# Altium footprint library ICs And Semiconductors THD.PcbLib: 350 footprints (part 12 of 22)
Each footprint in its own frame and in the unit in brackets; x right, y up, seen from the top. Pads: shape width x height; smd on the part's side, far side on the other; paste and mask are expansions set on the pad; w line width, h text height; cw(c..) or ccw(c..) is an arc to the next point about the centre after c.
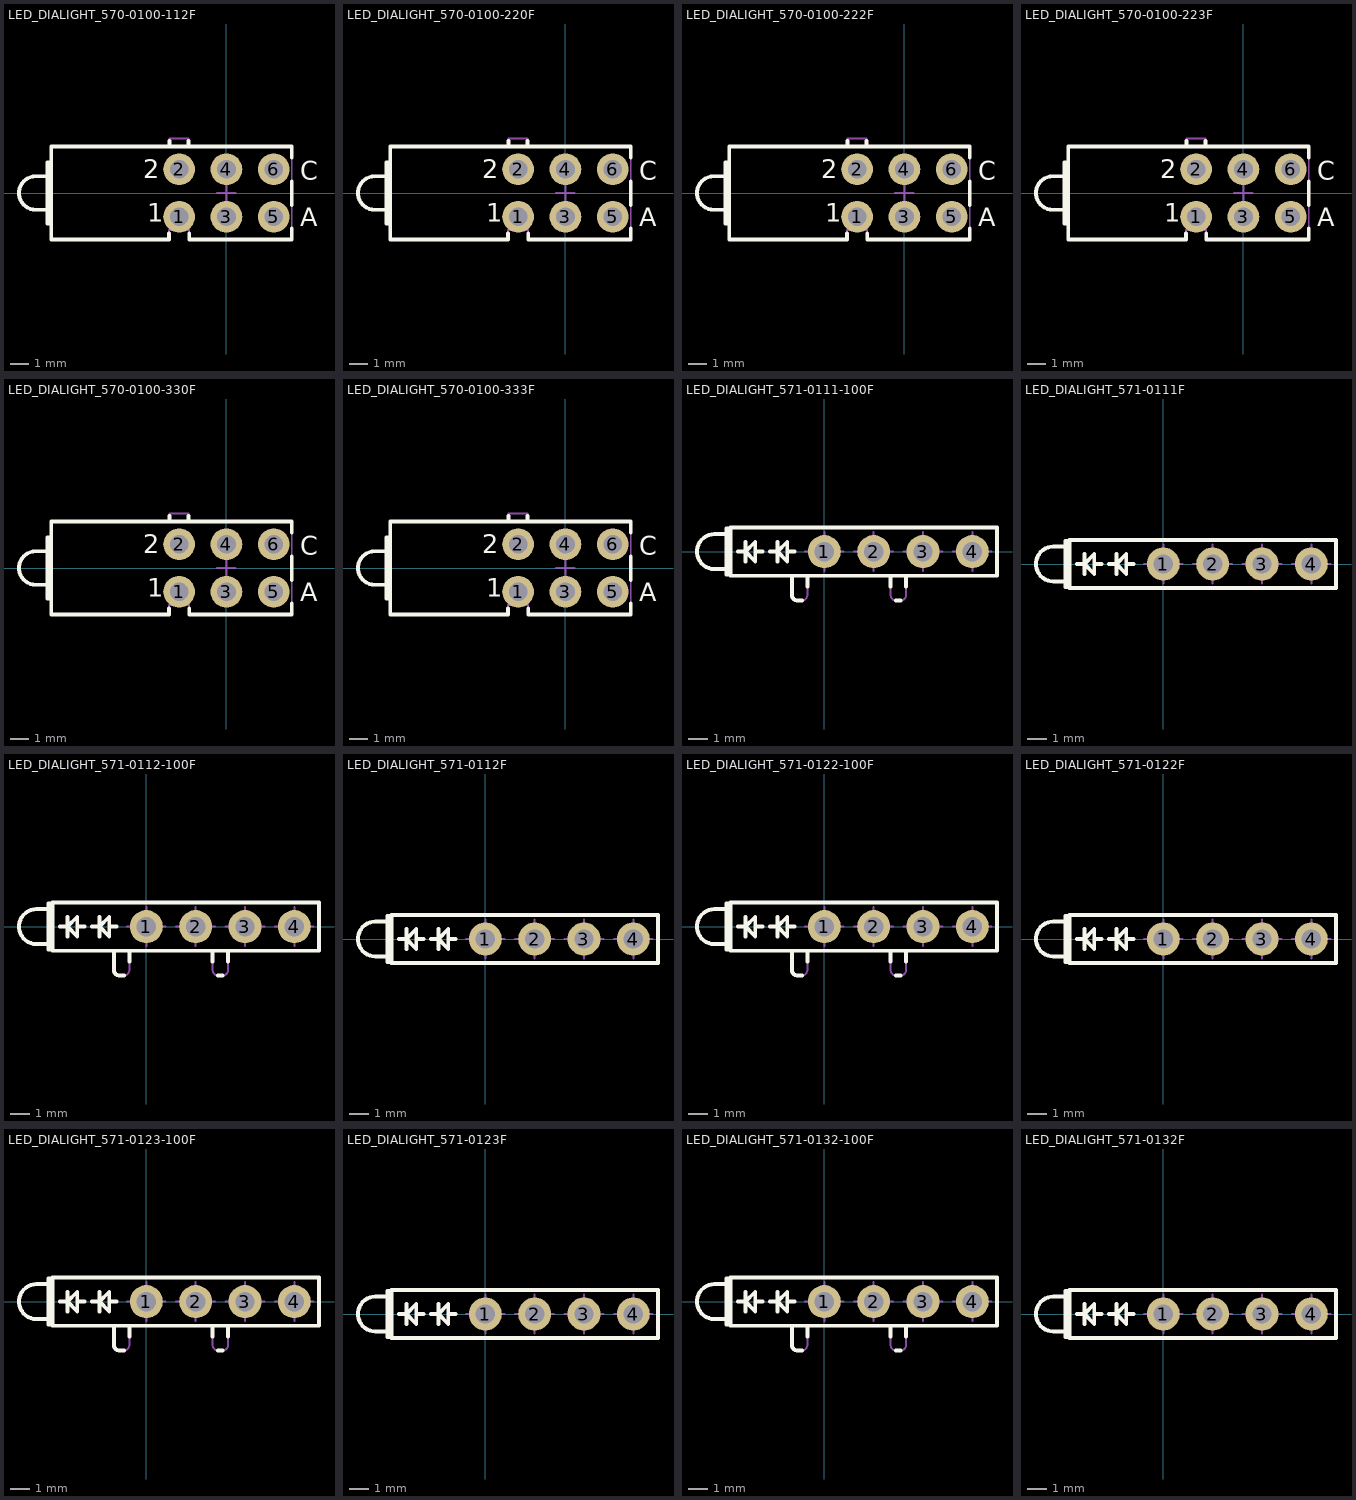
[diagram p11: the footprints below, top view; thin cyan lines are the x and y axes]

## LED_DIALIGHT_570-0100-112F [mm] "3x 2mm LED (Top: Red , Middle: Red, Bot: Green) PCB Edge Mounting DIALIGHT 570 Serie"
height 10.41
pads (6):
  round 1.7 hole 1: 1(-2.54,-1.27) 2(-2.54,1.27) 3(0,-1.27) 4(0,1.27) 5(2.54,-1.27) 6(2.54,1.27)
Top Overlay:
  lines w0.2: -9.59,-0.9 -10.22,-0.9 cw(c-10.22,0) -10.22,0.9 -9.59,0.9 ; -9.39,-1.651 -9.59,-1.651 -9.59,1.651 -9.39,1.651 ; -9.39,2.485 -9.39,-2.485 -3.086,-2.485 -3.086,-2.167 ; -3.086,2.493 -9.39,2.493 3.5,2.493 ; -3.048,2.493 -3.048,2.789 ; -2.032,2.493 -2.032,2.789 ; -1.994,-2.167 -1.994,-2.485 3.5,-2.485 3.5,-1.903 ; -1.994,2.493 3.5,2.493 ; 3.5,-0.637 3.5,0.637 ; 3.5,1.903 3.5,2.493
  text "2" at -4.458,0.79 h1
  text "1" at -4.243,-1.53 h1
  text "C" at 3.96,0.705 h1
  text "A" at 3.96,-1.79 h1
Notvisible:
  lines w0.1: -3.04,-1.27 -2.54,-1.27 ; -3.04,-1.27 -2.54,-1.27 ; -3.04,-1.27 -2.54,-1.27 ; -3.04,1.27 -2.54,1.27 ; -3.04,1.27 -2.54,1.27 ; -3.04,1.27 -2.54,1.27 ; -2.54,-1.77 -2.54,-1.27 ; -2.54,-1.77 -2.54,-1.27 ; -2.54,-1.77 -2.54,-1.27 ; -2.54,-1.27 -2.04,-1.27 ; -2.54,-1.27 -2.54,-0.77 ; -2.54,-1.27 -2.04,-1.27 ; -2.54,-1.27 -2.54,-0.77 ; -2.54,-1.27 -2.04,-1.27 ; -2.54,-1.27 -2.54,-0.77 ; -2.54,0.77 -2.54,1.27 ; -2.54,0.77 -2.54,1.27 ; -2.54,0.77 -2.54,1.27 ; -2.54,1.27 -2.04,1.27 ; -2.54,1.27 -2.54,1.77 ; -2.54,1.27 -2.04,1.27 ; -2.54,1.27 -2.54,1.77 ; -2.54,1.27 -2.04,1.27 ; -2.54,1.27 -2.54,1.77 ; -0.5,-1.27 0,-1.27 ; -0.5,-1.27 0,-1.27 ; -0.5,-1.27 0,-1.27 ; -0.5,0 0,0 ; -0.5,0 0,0 ; -0.5,0 0,0 ; -0.5,1.27 0,1.27 ; -0.5,1.27 0,1.27 ; -0.5,1.27 0,1.27 ; 0,-1.77 0,-1.27 ; 0,-1.77 0,-1.27 ; 0,-1.77 0,-1.27 ; 0,-1.27 0.5,-1.27 ; 0,-1.27 0,-0.77 ; 0,-1.27 0.5,-1.27 ; 0,-1.27 0,-0.77 ; 0,-1.27 0.5,-1.27 ; 0,-1.27 0,-0.77 ; 0,-0.5 0,0 ; 0,-0.5 0,0 ; 0,-0.5 0,0 ; 0,0 0.5,0 ; 0,0 0,0.5 ; 0,0 0.5,0 ; 0,0 0,0.5 ; 0,0 0.5,0 ; 0,0 0,0.5 ; 0,0.77 0,1.27 ; 0,0.77 0,1.27 ; 0,0.77 0,1.27 ; 0,1.27 0.5,1.27 ; 0,1.27 0,1.77 ; 0,1.27 0.5,1.27 ; 0,1.27 0,1.77 ; 0,1.27 0.5,1.27 ; 0,1.27 0,1.77 ; 2.04,-1.27 2.54,-1.27 ; 2.04,-1.27 2.54,-1.27 ; 2.04,-1.27 2.54,-1.27 ; 2.04,1.27 2.54,1.27 ; 2.04,1.27 2.54,1.27 ; 2.04,1.27 2.54,1.27 ; 2.54,-1.77 2.54,-1.27 ; 2.54,-1.77 2.54,-1.27 ; 2.54,-1.77 2.54,-1.27 ; 2.54,-1.27 3.04,-1.27 ; 2.54,-1.27 2.54,-0.77 ; 2.54,-1.27 3.04,-1.27 ; 2.54,-1.27 2.54,-0.77 ; 2.54,-1.27 3.04,-1.27 ; 2.54,-1.27 2.54,-0.77 ; 2.54,0.77 2.54,1.27 ; 2.54,0.77 2.54,1.27 ; 2.54,0.77 2.54,1.27 ; 2.54,1.27 3.04,1.27 ; 2.54,1.27 2.54,1.77 ; 2.54,1.27 3.04,1.27 ; 2.54,1.27 2.54,1.77 ; 2.54,1.27 3.04,1.27 ; 2.54,1.27 2.54,1.77
Mechanical 14:
  lines w0.1: -3.048,2.485 -3.048,2.917 ; -2.032,2.485 -2.032,2.917 ; -10.22,-0.9 cw(c-10.22,0) -10.22,0.9 ; -10.22,-0.9 cw(c-10.22,0) -10.22,0.9 ; -10.22,-0.9 cw(c-10.22,0) -10.22,0.9 ; -10.22,-0.9 -9.59,-0.9 ; -10.22,-0.9 -9.59,-0.9 ; -10.22,-0.9 -9.59,-0.9 ; -10.22,0.9 -9.59,0.9 ; -10.22,0.9 -9.59,0.9 ; -10.22,0.9 -9.59,0.9 ; -9.59,-1.651 -9.39,-1.651 ; -9.59,-1.651 -9.59,1.651 ; -9.59,-1.651 -9.39,-1.651 ; -9.59,-1.651 -9.59,1.651 ; -9.59,-1.651 -9.39,-1.651 ; -9.59,-1.651 -9.59,1.651 ; -9.59,1.651 -9.39,1.651 ; -9.59,1.651 -9.39,1.651 ; -9.59,1.651 -9.39,1.651 ; -9.39,-2.485 -3.086,-2.485 ; -9.39,-2.485 -9.39,2.485 ; -9.39,-2.485 -3.086,-2.485 ; -9.39,-2.485 -9.39,2.485 ; -9.39,-2.485 -3.086,-2.485 ; -9.39,-2.485 -9.39,2.485 ; -9.39,2.493 3.5,2.493 ; -9.39,2.493 -3.048,2.493 ; -9.39,2.493 -3.048,2.493 ; -3.086,-2.485 -3.086,-1.977 ; -3.086,-2.485 -3.086,-1.977 ; -3.086,-2.485 -3.086,-1.977 ; -3.086,-1.977 -1.994,-1.977 ; -3.086,-1.977 -1.994,-1.977 ; -3.086,-1.977 -1.994,-1.977 ; -3.048,2.493 -3.048,2.917 ; -3.048,2.493 -3.048,2.917 ; -3.048,2.917 -2.032,2.917 ; -3.048,2.917 -2.032,2.917 ; -3.048,2.917 -2.032,2.917 ; -2.032,2.493 -2.032,2.917 ; -2.032,2.493 3.5,2.493 ; -2.032,2.493 -2.032,2.917 ; -1.994,-2.485 3.5,-2.485 ; -1.994,-2.485 -1.994,-1.977 ; -1.994,-2.485 3.5,-2.485 ; -1.994,-2.485 -1.994,-1.977 ; -1.994,-2.485 3.5,-2.485 ; -1.994,-2.485 -1.994,-1.977 ; 3.5,-2.485 3.5,2.493 ; 3.5,-2.485 3.5,2.493 ; 3.5,-2.485 3.5,2.493
  text "2" at -4.458,0.79 h1
  text "1" at -4.243,-1.53 h1
  text "C" at 3.96,0.705 h1
  text "A" at 3.96,-1.79 h1
3D body "LED_DIALIGHT_570-0100-112F.stp": height 10.41, standoff -3.2, extent -11.12,-2.485 3.5,2.917

## LED_DIALIGHT_570-0100-220F [mm] "3x 2mm LED (Top: Green , Middle: Green, Bot: Blank) PCB Edge Mounting DIALIGHT 570 Serie"
height 10.41
pads (6):
  round 1.7 hole 1: 1(-2.54,-1.27) 2(-2.54,1.27) 3(0,-1.27) 4(0,1.27) 5(2.54,-1.27) 6(2.54,1.27)
Top Overlay:
  lines w0.2: -9.59,-0.9 -10.22,-0.9 cw(c-10.22,0) -10.22,0.9 -9.59,0.9 ; -9.39,-1.651 -9.59,-1.651 -9.59,1.651 -9.39,1.651 ; -9.39,2.485 -9.39,-2.485 -3.086,-2.485 -3.086,-2.167 ; -3.086,2.493 -9.39,2.493 3.5,2.493 ; -3.048,2.493 -3.048,2.789 ; -2.032,2.493 -2.032,2.789 ; -1.994,-2.167 -1.994,-2.485 3.5,-2.485 3.5,-1.903 ; -1.994,2.493 3.5,2.493 ; 3.5,-0.637 3.5,0.637 ; 3.5,1.903 3.5,2.493
  text "A" at 3.96,-1.79 h1
  text "C" at 3.96,0.705 h1
  text "1" at -4.243,-1.53 h1
  text "2" at -4.458,0.79 h1
Notvisible:
  lines w0.1: -3.04,-1.27 -2.54,-1.27 ; -3.04,-1.27 -2.54,-1.27 ; -3.04,-1.27 -2.54,-1.27 ; -3.04,1.27 -2.54,1.27 ; -3.04,1.27 -2.54,1.27 ; -3.04,1.27 -2.54,1.27 ; -2.54,-1.77 -2.54,-1.27 ; -2.54,-1.77 -2.54,-1.27 ; -2.54,-1.77 -2.54,-1.27 ; -2.54,-1.27 -2.54,-0.77 ; -2.54,-1.27 -2.04,-1.27 ; -2.54,-1.27 -2.54,-0.77 ; -2.54,-1.27 -2.04,-1.27 ; -2.54,-1.27 -2.04,-1.27 ; -2.54,-1.27 -2.54,-0.77 ; -2.54,0.77 -2.54,1.27 ; -2.54,0.77 -2.54,1.27 ; -2.54,0.77 -2.54,1.27 ; -2.54,1.27 -2.54,1.77 ; -2.54,1.27 -2.04,1.27 ; -2.54,1.27 -2.54,1.77 ; -2.54,1.27 -2.04,1.27 ; -2.54,1.27 -2.04,1.27 ; -2.54,1.27 -2.54,1.77 ; -0.5,-1.27 0,-1.27 ; -0.5,-1.27 0,-1.27 ; -0.5,-1.27 0,-1.27 ; -0.5,0 0,0 ; -0.5,0 0,0 ; -0.5,0 0,0 ; -0.5,1.27 0,1.27 ; -0.5,1.27 0,1.27 ; -0.5,1.27 0,1.27 ; 0,-1.77 0,-1.27 ; 0,-1.77 0,-1.27 ; 0,-1.77 0,-1.27 ; 0,-1.27 0,-0.77 ; 0,-1.27 0.5,-1.27 ; 0,-1.27 0,-0.77 ; 0,-1.27 0.5,-1.27 ; 0,-1.27 0.5,-1.27 ; 0,-1.27 0,-0.77 ; 0,-0.5 0,0 ; 0,-0.5 0,0 ; 0,-0.5 0,0 ; 0,0 0,0.5 ; 0,0 0.5,0 ; 0,0 0,0.5 ; 0,0 0.5,0 ; 0,0 0.5,0 ; 0,0 0,0.5 ; 0,0.77 0,1.27 ; 0,0.77 0,1.27 ; 0,0.77 0,1.27 ; 0,1.27 0,1.77 ; 0,1.27 0.5,1.27 ; 0,1.27 0,1.77 ; 0,1.27 0.5,1.27 ; 0,1.27 0.5,1.27 ; 0,1.27 0,1.77 ; 2.04,-1.27 2.54,-1.27 ; 2.04,-1.27 2.54,-1.27 ; 2.04,-1.27 2.54,-1.27 ; 2.04,1.27 2.54,1.27 ; 2.04,1.27 2.54,1.27 ; 2.04,1.27 2.54,1.27 ; 2.54,-1.77 2.54,-1.27 ; 2.54,-1.77 2.54,-1.27 ; 2.54,-1.77 2.54,-1.27 ; 2.54,-1.27 2.54,-0.77 ; 2.54,-1.27 3.04,-1.27 ; 2.54,-1.27 2.54,-0.77 ; 2.54,-1.27 3.04,-1.27 ; 2.54,-1.27 3.04,-1.27 ; 2.54,-1.27 2.54,-0.77 ; 2.54,0.77 2.54,1.27 ; 2.54,0.77 2.54,1.27 ; 2.54,0.77 2.54,1.27 ; 2.54,1.27 2.54,1.77 ; 2.54,1.27 3.04,1.27 ; 2.54,1.27 2.54,1.77 ; 2.54,1.27 3.04,1.27 ; 2.54,1.27 3.04,1.27 ; 2.54,1.27 2.54,1.77
Mechanical 14:
  lines w0.1: -3.048,2.485 -3.048,2.917 ; -2.032,2.485 -2.032,2.917 ; -10.22,-0.9 cw(c-10.22,0) -10.22,0.9 ; -10.22,-0.9 cw(c-10.22,0) -10.22,0.9 ; -10.22,-0.9 cw(c-10.22,0) -10.22,0.9 ; -10.22,-0.9 -9.59,-0.9 ; -10.22,-0.9 -9.59,-0.9 ; -10.22,-0.9 -9.59,-0.9 ; -10.22,0.9 -9.59,0.9 ; -10.22,0.9 -9.59,0.9 ; -10.22,0.9 -9.59,0.9 ; -9.59,-1.651 -9.59,1.651 ; -9.59,-1.651 -9.39,-1.651 ; -9.59,-1.651 -9.59,1.651 ; -9.59,-1.651 -9.39,-1.651 ; -9.59,-1.651 -9.39,-1.651 ; -9.59,-1.651 -9.59,1.651 ; -9.59,1.651 -9.39,1.651 ; -9.59,1.651 -9.39,1.651 ; -9.59,1.651 -9.39,1.651 ; -9.39,-2.485 -9.39,2.485 ; -9.39,-2.485 -3.086,-2.485 ; -9.39,-2.485 -9.39,2.485 ; -9.39,-2.485 -3.086,-2.485 ; -9.39,-2.485 -3.086,-2.485 ; -9.39,-2.485 -9.39,2.485 ; -9.39,2.493 -3.048,2.493 ; -9.39,2.493 3.5,2.493 ; -9.39,2.493 -3.048,2.493 ; -3.086,-2.485 -3.086,-1.977 ; -3.086,-2.485 -3.086,-1.977 ; -3.086,-2.485 -3.086,-1.977 ; -3.086,-1.977 -1.994,-1.977 ; -3.086,-1.977 -1.994,-1.977 ; -3.086,-1.977 -1.994,-1.977 ; -3.048,2.493 -3.048,2.917 ; -3.048,2.493 -3.048,2.917 ; -3.048,2.917 -2.032,2.917 ; -3.048,2.917 -2.032,2.917 ; -3.048,2.917 -2.032,2.917 ; -2.032,2.493 -2.032,2.917 ; -2.032,2.493 3.5,2.493 ; -2.032,2.493 -2.032,2.917 ; -1.994,-2.485 -1.994,-1.977 ; -1.994,-2.485 3.5,-2.485 ; -1.994,-2.485 -1.994,-1.977 ; -1.994,-2.485 3.5,-2.485 ; -1.994,-2.485 3.5,-2.485 ; -1.994,-2.485 -1.994,-1.977 ; 3.5,-2.485 3.5,2.493 ; 3.5,-2.485 3.5,2.493 ; 3.5,-2.485 3.5,2.493
  text "A" at 3.96,-1.79 h1
  text "C" at 3.96,0.705 h1
  text "1" at -4.243,-1.53 h1
  text "2" at -4.458,0.79 h1
3D body "LED_DIALIGHT_570-0100-220F.stp": height 10.41, standoff -3.2, extent -11.12,-2.485 3.5,2.917

## LED_DIALIGHT_570-0100-222F [mm] "3x Green LED 2mm PCB Edge Mounting DIALIGHT 570 Serie"
height 10.41
pads (6):
  round 1.7 hole 1: 1(-2.54,-1.27) 2(-2.54,1.27) 3(0,-1.27) 4(0,1.27) 5(2.54,-1.27) 6(2.54,1.27)
Top Overlay:
  lines w0.2: -9.59,-0.9 -10.22,-0.9 cw(c-10.22,0) -10.22,0.9 -9.59,0.9 ; -9.39,-1.651 -9.59,-1.651 -9.59,1.651 -9.39,1.651 ; -9.39,2.485 -9.39,-2.485 -3.086,-2.485 -3.086,-2.167 ; -3.086,2.493 -9.39,2.493 3.5,2.493 ; -3.048,2.493 -3.048,2.789 ; -2.032,2.493 -2.032,2.789 ; -1.994,-2.167 -1.994,-2.485 3.5,-2.485 3.5,-1.903 ; -1.994,2.493 3.5,2.493 ; 3.5,-0.637 3.5,0.637 ; 3.5,1.903 3.5,2.493
  text "2" at -4.458,0.79 h1
  text "1" at -4.243,-1.53 h1
  text "C" at 3.96,0.705 h1
  text "A" at 3.96,-1.79 h1
Notvisible:
  lines w0.1: -3.04,-1.27 -2.54,-1.27 ; -3.04,-1.27 -2.54,-1.27 ; -3.04,-1.27 -2.54,-1.27 ; -3.04,1.27 -2.54,1.27 ; -3.04,1.27 -2.54,1.27 ; -3.04,1.27 -2.54,1.27 ; -2.54,-1.77 -2.54,-1.27 ; -2.54,-1.77 -2.54,-1.27 ; -2.54,-1.77 -2.54,-1.27 ; -2.54,-1.27 -2.54,-0.77 ; -2.54,-1.27 -2.04,-1.27 ; -2.54,-1.27 -2.04,-1.27 ; -2.54,-1.27 -2.54,-0.77 ; -2.54,-1.27 -2.04,-1.27 ; -2.54,-1.27 -2.54,-0.77 ; -2.54,0.77 -2.54,1.27 ; -2.54,0.77 -2.54,1.27 ; -2.54,0.77 -2.54,1.27 ; -2.54,1.27 -2.54,1.77 ; -2.54,1.27 -2.04,1.27 ; -2.54,1.27 -2.04,1.27 ; -2.54,1.27 -2.54,1.77 ; -2.54,1.27 -2.04,1.27 ; -2.54,1.27 -2.54,1.77 ; -0.5,-1.27 0,-1.27 ; -0.5,-1.27 0,-1.27 ; -0.5,-1.27 0,-1.27 ; -0.5,0 0,0 ; -0.5,0 0,0 ; -0.5,0 0,0 ; -0.5,1.27 0,1.27 ; -0.5,1.27 0,1.27 ; -0.5,1.27 0,1.27 ; 0,-1.77 0,-1.27 ; 0,-1.77 0,-1.27 ; 0,-1.77 0,-1.27 ; 0,-1.27 0,-0.77 ; 0,-1.27 0.5,-1.27 ; 0,-1.27 0.5,-1.27 ; 0,-1.27 0,-0.77 ; 0,-1.27 0.5,-1.27 ; 0,-1.27 0,-0.77 ; 0,-0.5 0,0 ; 0,-0.5 0,0 ; 0,-0.5 0,0 ; 0,0 0,0.5 ; 0,0 0.5,0 ; 0,0 0.5,0 ; 0,0 0,0.5 ; 0,0 0.5,0 ; 0,0 0,0.5 ; 0,0.77 0,1.27 ; 0,0.77 0,1.27 ; 0,0.77 0,1.27 ; 0,1.27 0,1.77 ; 0,1.27 0.5,1.27 ; 0,1.27 0.5,1.27 ; 0,1.27 0,1.77 ; 0,1.27 0.5,1.27 ; 0,1.27 0,1.77 ; 2.04,-1.27 2.54,-1.27 ; 2.04,-1.27 2.54,-1.27 ; 2.04,-1.27 2.54,-1.27 ; 2.04,1.27 2.54,1.27 ; 2.04,1.27 2.54,1.27 ; 2.04,1.27 2.54,1.27 ; 2.54,-1.77 2.54,-1.27 ; 2.54,-1.77 2.54,-1.27 ; 2.54,-1.77 2.54,-1.27 ; 2.54,-1.27 2.54,-0.77 ; 2.54,-1.27 3.04,-1.27 ; 2.54,-1.27 3.04,-1.27 ; 2.54,-1.27 2.54,-0.77 ; 2.54,-1.27 3.04,-1.27 ; 2.54,-1.27 2.54,-0.77 ; 2.54,0.77 2.54,1.27 ; 2.54,0.77 2.54,1.27 ; 2.54,0.77 2.54,1.27 ; 2.54,1.27 2.54,1.77 ; 2.54,1.27 3.04,1.27 ; 2.54,1.27 3.04,1.27 ; 2.54,1.27 2.54,1.77 ; 2.54,1.27 3.04,1.27 ; 2.54,1.27 2.54,1.77
Mechanical 14:
  lines w0.1: -3.048,2.485 -3.048,2.917 ; -2.032,2.485 -2.032,2.917 ; -10.22,-0.9 cw(c-10.22,0) -10.22,0.9 ; -10.22,-0.9 cw(c-10.22,0) -10.22,0.9 ; -10.22,-0.9 cw(c-10.22,0) -10.22,0.9 ; -10.22,-0.9 -9.59,-0.9 ; -10.22,-0.9 -9.59,-0.9 ; -10.22,-0.9 -9.59,-0.9 ; -10.22,0.9 -9.59,0.9 ; -10.22,0.9 -9.59,0.9 ; -10.22,0.9 -9.59,0.9 ; -9.59,-1.651 -9.59,1.651 ; -9.59,-1.651 -9.39,-1.651 ; -9.59,-1.651 -9.39,-1.651 ; -9.59,-1.651 -9.59,1.651 ; -9.59,-1.651 -9.39,-1.651 ; -9.59,-1.651 -9.59,1.651 ; -9.59,1.651 -9.39,1.651 ; -9.59,1.651 -9.39,1.651 ; -9.59,1.651 -9.39,1.651 ; -9.39,-2.485 -9.39,2.485 ; -9.39,-2.485 -3.086,-2.485 ; -9.39,-2.485 -3.086,-2.485 ; -9.39,-2.485 -9.39,2.485 ; -9.39,-2.485 -3.086,-2.485 ; -9.39,-2.485 -9.39,2.485 ; -9.39,2.493 -3.048,2.493 ; -9.39,2.493 3.5,2.493 ; -9.39,2.493 -3.048,2.493 ; -3.086,-2.485 -3.086,-1.977 ; -3.086,-2.485 -3.086,-1.977 ; -3.086,-2.485 -3.086,-1.977 ; -3.086,-1.977 -1.994,-1.977 ; -3.086,-1.977 -1.994,-1.977 ; -3.086,-1.977 -1.994,-1.977 ; -3.048,2.493 -3.048,2.917 ; -3.048,2.493 -3.048,2.917 ; -3.048,2.917 -2.032,2.917 ; -3.048,2.917 -2.032,2.917 ; -3.048,2.917 -2.032,2.917 ; -2.032,2.493 -2.032,2.917 ; -2.032,2.493 3.5,2.493 ; -2.032,2.493 -2.032,2.917 ; -1.994,-2.485 -1.994,-1.977 ; -1.994,-2.485 3.5,-2.485 ; -1.994,-2.485 3.5,-2.485 ; -1.994,-2.485 -1.994,-1.977 ; -1.994,-2.485 3.5,-2.485 ; -1.994,-2.485 -1.994,-1.977 ; 3.5,-2.485 3.5,2.493 ; 3.5,-2.485 3.5,2.493 ; 3.5,-2.485 3.5,2.493
  text "2" at -4.458,0.79 h1
  text "1" at -4.243,-1.53 h1
  text "C" at 3.96,0.705 h1
  text "A" at 3.96,-1.79 h1
3D body "LED_DIALIGHT_570-0100-222F.stp": height 10.41, standoff -3.2, extent -11.12,-2.485 3.5,2.917

## LED_DIALIGHT_570-0100-223F [mm] "3x 2mm LED (Top: Green , Middle: Green, Bot: Yellow) PCB Edge Mounting DIALIGHT 570 Serie"
height 10.41
pads (6):
  round 1.7 hole 1: 1(-2.54,-1.27) 2(-2.54,1.27) 3(0,-1.27) 4(0,1.27) 5(2.54,-1.27) 6(2.54,1.27)
Top Overlay:
  lines w0.2: -9.59,-0.9 -10.22,-0.9 cw(c-10.22,0) -10.22,0.9 -9.59,0.9 ; -9.39,-1.651 -9.59,-1.651 -9.59,1.651 -9.39,1.651 ; -9.39,2.485 -9.39,-2.485 -3.086,-2.485 -3.086,-2.167 ; -3.086,2.493 -9.39,2.493 3.5,2.493 ; -3.048,2.493 -3.048,2.789 ; -2.032,2.493 -2.032,2.789 ; -1.994,-2.167 -1.994,-2.485 3.5,-2.485 3.5,-1.903 ; -1.994,2.493 3.5,2.493 ; 3.5,-0.637 3.5,0.637 ; 3.5,1.903 3.5,2.493
  text "2" at -4.458,0.79 h1
  text "1" at -4.243,-1.53 h1
  text "C" at 3.96,0.705 h1
  text "A" at 3.96,-1.79 h1
Notvisible:
  lines w0.1: -3.04,-1.27 -2.54,-1.27 ; -3.04,-1.27 -2.54,-1.27 ; -3.04,-1.27 -2.54,-1.27 ; -3.04,1.27 -2.54,1.27 ; -3.04,1.27 -2.54,1.27 ; -3.04,1.27 -2.54,1.27 ; -2.54,-1.77 -2.54,-1.27 ; -2.54,-1.77 -2.54,-1.27 ; -2.54,-1.77 -2.54,-1.27 ; -2.54,-1.27 -2.04,-1.27 ; -2.54,-1.27 -2.54,-0.77 ; -2.54,-1.27 -2.04,-1.27 ; -2.54,-1.27 -2.54,-0.77 ; -2.54,-1.27 -2.04,-1.27 ; -2.54,-1.27 -2.54,-0.77 ; -2.54,0.77 -2.54,1.27 ; -2.54,0.77 -2.54,1.27 ; -2.54,0.77 -2.54,1.27 ; -2.54,1.27 -2.04,1.27 ; -2.54,1.27 -2.54,1.77 ; -2.54,1.27 -2.04,1.27 ; -2.54,1.27 -2.54,1.77 ; -2.54,1.27 -2.04,1.27 ; -2.54,1.27 -2.54,1.77 ; -0.5,-1.27 0,-1.27 ; -0.5,-1.27 0,-1.27 ; -0.5,-1.27 0,-1.27 ; -0.5,0 0,0 ; -0.5,0 0,0 ; -0.5,0 0,0 ; -0.5,1.27 0,1.27 ; -0.5,1.27 0,1.27 ; -0.5,1.27 0,1.27 ; 0,-1.77 0,-1.27 ; 0,-1.77 0,-1.27 ; 0,-1.77 0,-1.27 ; 0,-1.27 0.5,-1.27 ; 0,-1.27 0,-0.77 ; 0,-1.27 0.5,-1.27 ; 0,-1.27 0,-0.77 ; 0,-1.27 0.5,-1.27 ; 0,-1.27 0,-0.77 ; 0,-0.5 0,0 ; 0,-0.5 0,0 ; 0,-0.5 0,0 ; 0,0 0.5,0 ; 0,0 0,0.5 ; 0,0 0.5,0 ; 0,0 0,0.5 ; 0,0 0.5,0 ; 0,0 0,0.5 ; 0,0.77 0,1.27 ; 0,0.77 0,1.27 ; 0,0.77 0,1.27 ; 0,1.27 0.5,1.27 ; 0,1.27 0,1.77 ; 0,1.27 0.5,1.27 ; 0,1.27 0,1.77 ; 0,1.27 0.5,1.27 ; 0,1.27 0,1.77 ; 2.04,-1.27 2.54,-1.27 ; 2.04,-1.27 2.54,-1.27 ; 2.04,-1.27 2.54,-1.27 ; 2.04,1.27 2.54,1.27 ; 2.04,1.27 2.54,1.27 ; 2.04,1.27 2.54,1.27 ; 2.54,-1.77 2.54,-1.27 ; 2.54,-1.77 2.54,-1.27 ; 2.54,-1.77 2.54,-1.27 ; 2.54,-1.27 3.04,-1.27 ; 2.54,-1.27 2.54,-0.77 ; 2.54,-1.27 3.04,-1.27 ; 2.54,-1.27 2.54,-0.77 ; 2.54,-1.27 3.04,-1.27 ; 2.54,-1.27 2.54,-0.77 ; 2.54,0.77 2.54,1.27 ; 2.54,0.77 2.54,1.27 ; 2.54,0.77 2.54,1.27 ; 2.54,1.27 3.04,1.27 ; 2.54,1.27 2.54,1.77 ; 2.54,1.27 3.04,1.27 ; 2.54,1.27 2.54,1.77 ; 2.54,1.27 3.04,1.27 ; 2.54,1.27 2.54,1.77
Mechanical 14:
  lines w0.1: -3.048,2.485 -3.048,2.917 ; -2.032,2.485 -2.032,2.917 ; -10.22,-0.9 cw(c-10.22,0) -10.22,0.9 ; -10.22,-0.9 cw(c-10.22,0) -10.22,0.9 ; -10.22,-0.9 cw(c-10.22,0) -10.22,0.9 ; -10.22,-0.9 -9.59,-0.9 ; -10.22,-0.9 -9.59,-0.9 ; -10.22,-0.9 -9.59,-0.9 ; -10.22,0.9 -9.59,0.9 ; -10.22,0.9 -9.59,0.9 ; -10.22,0.9 -9.59,0.9 ; -9.59,-1.651 -9.39,-1.651 ; -9.59,-1.651 -9.59,1.651 ; -9.59,-1.651 -9.39,-1.651 ; -9.59,-1.651 -9.59,1.651 ; -9.59,-1.651 -9.39,-1.651 ; -9.59,-1.651 -9.59,1.651 ; -9.59,1.651 -9.39,1.651 ; -9.59,1.651 -9.39,1.651 ; -9.59,1.651 -9.39,1.651 ; -9.39,-2.485 -3.086,-2.485 ; -9.39,-2.485 -9.39,2.485 ; -9.39,-2.485 -3.086,-2.485 ; -9.39,-2.485 -9.39,2.485 ; -9.39,-2.485 -3.086,-2.485 ; -9.39,-2.485 -9.39,2.485 ; -9.39,2.493 3.5,2.493 ; -9.39,2.493 -3.048,2.493 ; -9.39,2.493 -3.048,2.493 ; -3.086,-2.485 -3.086,-1.977 ; -3.086,-2.485 -3.086,-1.977 ; -3.086,-2.485 -3.086,-1.977 ; -3.086,-1.977 -1.994,-1.977 ; -3.086,-1.977 -1.994,-1.977 ; -3.086,-1.977 -1.994,-1.977 ; -3.048,2.493 -3.048,2.917 ; -3.048,2.493 -3.048,2.917 ; -3.048,2.917 -2.032,2.917 ; -3.048,2.917 -2.032,2.917 ; -3.048,2.917 -2.032,2.917 ; -2.032,2.493 -2.032,2.917 ; -2.032,2.493 3.5,2.493 ; -2.032,2.493 -2.032,2.917 ; -1.994,-2.485 3.5,-2.485 ; -1.994,-2.485 -1.994,-1.977 ; -1.994,-2.485 3.5,-2.485 ; -1.994,-2.485 -1.994,-1.977 ; -1.994,-2.485 3.5,-2.485 ; -1.994,-2.485 -1.994,-1.977 ; 3.5,-2.485 3.5,2.493 ; 3.5,-2.485 3.5,2.493 ; 3.5,-2.485 3.5,2.493
  text "2" at -4.458,0.79 h1
  text "1" at -4.243,-1.53 h1
  text "C" at 3.96,0.705 h1
  text "A" at 3.96,-1.79 h1
3D body "LED_DIALIGHT_570-0100-223F.stp": height 10.41, standoff -3.2, extent -11.12,-2.485 3.5,2.917

## LED_DIALIGHT_570-0100-330F [mm] "3x 2mm LED (Top: Green , Middle: Green, Bot: Blank) PCB Edge Mounting DIALIGHT 570 Serie"
height 10.41
pads (6):
  round 1.7 hole 1: 1(-2.54,-1.27) 2(-2.54,1.27) 3(0,-1.27) 4(0,1.27) 5(2.54,-1.27) 6(2.54,1.27)
Top Overlay:
  lines w0.2: -9.59,-0.9 -10.22,-0.9 cw(c-10.22,0) -10.22,0.9 -9.59,0.9 ; -9.39,-1.651 -9.59,-1.651 -9.59,1.651 -9.39,1.651 ; -9.39,2.485 -9.39,-2.485 -3.086,-2.485 -3.086,-2.167 ; -3.086,2.493 -9.39,2.493 3.5,2.493 ; -3.048,2.493 -3.048,2.789 ; -2.032,2.493 -2.032,2.789 ; -1.994,-2.167 -1.994,-2.485 3.5,-2.485 3.5,-1.903 ; -1.994,2.493 3.5,2.493 ; 3.5,-0.637 3.5,0.637 ; 3.5,1.903 3.5,2.493
  text "2" at -4.458,0.79 h1
  text "1" at -4.243,-1.53 h1
  text "C" at 3.96,0.705 h1
  text "A" at 3.96,-1.79 h1
Notvisible:
  lines w0.1: -3.04,-1.27 -2.54,-1.27 ; -3.04,-1.27 -2.54,-1.27 ; -3.04,-1.27 -2.54,-1.27 ; -3.04,1.27 -2.54,1.27 ; -3.04,1.27 -2.54,1.27 ; -3.04,1.27 -2.54,1.27 ; -2.54,-1.77 -2.54,-1.27 ; -2.54,-1.77 -2.54,-1.27 ; -2.54,-1.77 -2.54,-1.27 ; -2.54,-1.27 -2.04,-1.27 ; -2.54,-1.27 -2.54,-0.77 ; -2.54,-1.27 -2.04,-1.27 ; -2.54,-1.27 -2.54,-0.77 ; -2.54,-1.27 -2.04,-1.27 ; -2.54,-1.27 -2.54,-0.77 ; -2.54,0.77 -2.54,1.27 ; -2.54,0.77 -2.54,1.27 ; -2.54,0.77 -2.54,1.27 ; -2.54,1.27 -2.04,1.27 ; -2.54,1.27 -2.54,1.77 ; -2.54,1.27 -2.04,1.27 ; -2.54,1.27 -2.54,1.77 ; -2.54,1.27 -2.04,1.27 ; -2.54,1.27 -2.54,1.77 ; -0.5,-1.27 0,-1.27 ; -0.5,-1.27 0,-1.27 ; -0.5,-1.27 0,-1.27 ; -0.5,0 0,0 ; -0.5,0 0,0 ; -0.5,0 0,0 ; -0.5,1.27 0,1.27 ; -0.5,1.27 0,1.27 ; -0.5,1.27 0,1.27 ; 0,-1.77 0,-1.27 ; 0,-1.77 0,-1.27 ; 0,-1.77 0,-1.27 ; 0,-1.27 0.5,-1.27 ; 0,-1.27 0,-0.77 ; 0,-1.27 0.5,-1.27 ; 0,-1.27 0,-0.77 ; 0,-1.27 0.5,-1.27 ; 0,-1.27 0,-0.77 ; 0,-0.5 0,0 ; 0,-0.5 0,0 ; 0,-0.5 0,0 ; 0,0 0.5,0 ; 0,0 0,0.5 ; 0,0 0.5,0 ; 0,0 0,0.5 ; 0,0 0.5,0 ; 0,0 0,0.5 ; 0,0.77 0,1.27 ; 0,0.77 0,1.27 ; 0,0.77 0,1.27 ; 0,1.27 0.5,1.27 ; 0,1.27 0,1.77 ; 0,1.27 0.5,1.27 ; 0,1.27 0,1.77 ; 0,1.27 0.5,1.27 ; 0,1.27 0,1.77 ; 2.04,-1.27 2.54,-1.27 ; 2.04,-1.27 2.54,-1.27 ; 2.04,-1.27 2.54,-1.27 ; 2.04,1.27 2.54,1.27 ; 2.04,1.27 2.54,1.27 ; 2.04,1.27 2.54,1.27 ; 2.54,-1.77 2.54,-1.27 ; 2.54,-1.77 2.54,-1.27 ; 2.54,-1.77 2.54,-1.27 ; 2.54,-1.27 3.04,-1.27 ; 2.54,-1.27 2.54,-0.77 ; 2.54,-1.27 3.04,-1.27 ; 2.54,-1.27 2.54,-0.77 ; 2.54,-1.27 3.04,-1.27 ; 2.54,-1.27 2.54,-0.77 ; 2.54,0.77 2.54,1.27 ; 2.54,0.77 2.54,1.27 ; 2.54,0.77 2.54,1.27 ; 2.54,1.27 3.04,1.27 ; 2.54,1.27 2.54,1.77 ; 2.54,1.27 3.04,1.27 ; 2.54,1.27 2.54,1.77 ; 2.54,1.27 3.04,1.27 ; 2.54,1.27 2.54,1.77
Mechanical 14:
  lines w0.1: -3.048,2.485 -3.048,2.917 ; -2.032,2.485 -2.032,2.917 ; -10.22,-0.9 cw(c-10.22,0) -10.22,0.9 ; -10.22,-0.9 cw(c-10.22,0) -10.22,0.9 ; -10.22,-0.9 cw(c-10.22,0) -10.22,0.9 ; -10.22,-0.9 -9.59,-0.9 ; -10.22,-0.9 -9.59,-0.9 ; -10.22,-0.9 -9.59,-0.9 ; -10.22,0.9 -9.59,0.9 ; -10.22,0.9 -9.59,0.9 ; -10.22,0.9 -9.59,0.9 ; -9.59,-1.651 -9.39,-1.651 ; -9.59,-1.651 -9.59,1.651 ; -9.59,-1.651 -9.39,-1.651 ; -9.59,-1.651 -9.59,1.651 ; -9.59,-1.651 -9.39,-1.651 ; -9.59,-1.651 -9.59,1.651 ; -9.59,1.651 -9.39,1.651 ; -9.59,1.651 -9.39,1.651 ; -9.59,1.651 -9.39,1.651 ; -9.39,-2.485 -3.086,-2.485 ; -9.39,-2.485 -9.39,2.485 ; -9.39,-2.485 -3.086,-2.485 ; -9.39,-2.485 -9.39,2.485 ; -9.39,-2.485 -3.086,-2.485 ; -9.39,-2.485 -9.39,2.485 ; -9.39,2.493 3.5,2.493 ; -9.39,2.493 -3.048,2.493 ; -9.39,2.493 -3.048,2.493 ; -3.086,-2.485 -3.086,-1.977 ; -3.086,-2.485 -3.086,-1.977 ; -3.086,-2.485 -3.086,-1.977 ; -3.086,-1.977 -1.994,-1.977 ; -3.086,-1.977 -1.994,-1.977 ; -3.086,-1.977 -1.994,-1.977 ; -3.048,2.493 -3.048,2.917 ; -3.048,2.493 -3.048,2.917 ; -3.048,2.917 -2.032,2.917 ; -3.048,2.917 -2.032,2.917 ; -3.048,2.917 -2.032,2.917 ; -2.032,2.493 -2.032,2.917 ; -2.032,2.493 3.5,2.493 ; -2.032,2.493 -2.032,2.917 ; -1.994,-2.485 3.5,-2.485 ; -1.994,-2.485 -1.994,-1.977 ; -1.994,-2.485 3.5,-2.485 ; -1.994,-2.485 -1.994,-1.977 ; -1.994,-2.485 3.5,-2.485 ; -1.994,-2.485 -1.994,-1.977 ; 3.5,-2.485 3.5,2.493 ; 3.5,-2.485 3.5,2.493 ; 3.5,-2.485 3.5,2.493
  text "2" at -4.458,0.79 h1
  text "1" at -4.243,-1.53 h1
  text "C" at 3.96,0.705 h1
  text "A" at 3.96,-1.79 h1
3D body "LED_DIALIGHT_570-0100-330F.stp": height 10.41, standoff -3.2, extent -11.12,-2.485 3.5,2.917
